# Altium footprint library LCD.PcbLib: 21 footprints (part 1 of 2)
Each footprint in its own frame and in the unit in brackets; x right, y up, seen from the top. Pads: shape width x height; smd on the part's side, far side on the other; paste and mask are expansions set on the pad; w line width, h text height; cw(c..) or ccw(c..) is an arc to the next point about the centre after c.
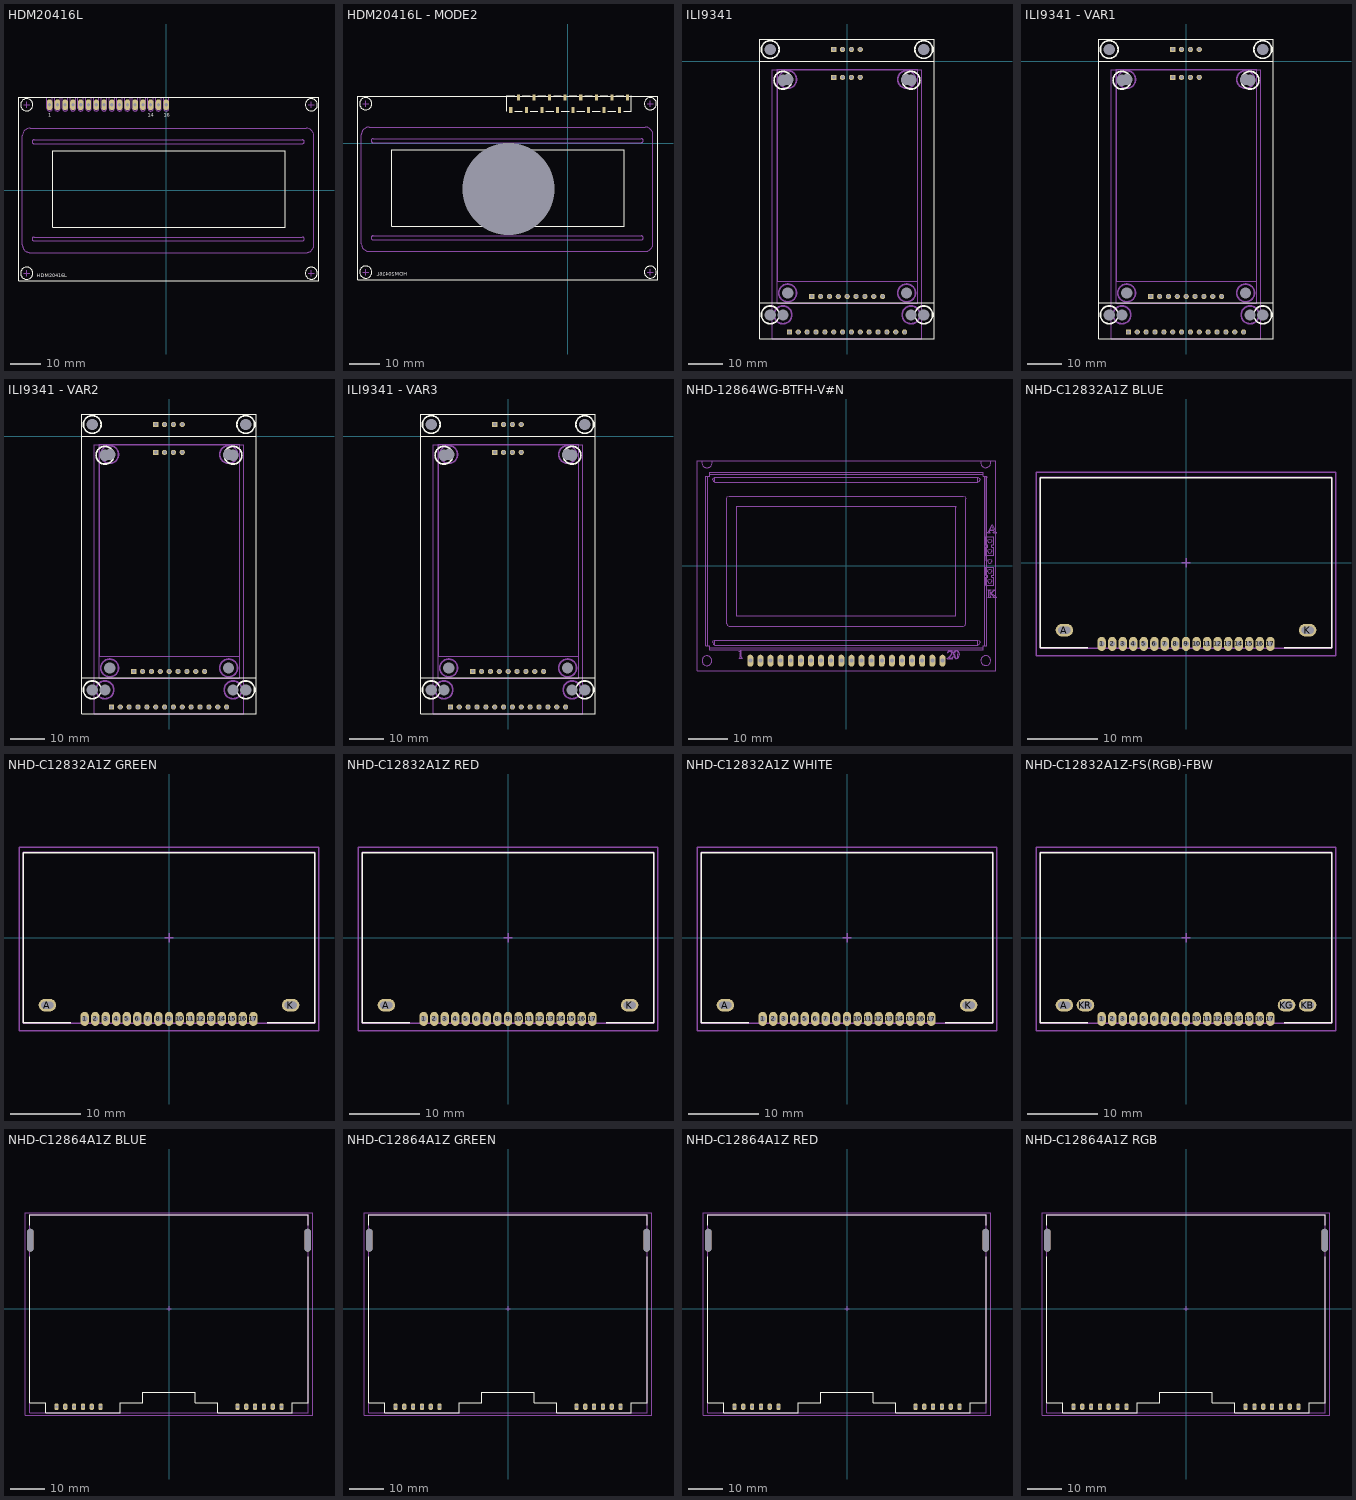
[diagram p0: the footprints below, top view; thin cyan lines are the x and y axes]

## HDM20416L [mil] "LCD 4X20 16 pins Dimensions 98 x 60 mm"
pads (16):
  oval 70x140 hole 40: 1(-1500.19,1100.28) 2(-1400.19,1100.28) 3(-1300.19,1100.28) 4(-1200.19,1100.28) 5(-1100.19,1100.28) 6(-1000.19,1100.28) 7(-900.19,1100.28) 8(-800.19,1100.28) 9(-700.19,1100.28) 10(-600.19,1100.28) 11(-500.19,1100.28) 12(-400.19,1100.28) 13(-300.19,1100.28) 14(-200.19,1100.28) 15(-100.19,1100.28) 16(-0.19,1100.28)
Top Overlay:
  circle w5: c-1795,1100 r78
  circle w5: c-1795,-1065.5 r78
  circle w5: c1866.5,-1065.5 r77.5
  circle w5: c1866,1100 r78.5
  lines w5: -1893.69,-1163.72 1964.57,-1163.72 1964.57,1198.48 -1893.69,1198.48 -1893.69,-1163.72 ; -1460.62,-474.74 -1460.62,509.51 1531.5,509.51 1531.5,-474.74 -1460.62,-474.74
  text "HDM20416L" at -1666.87,-1135.05 h77.5
  text "1" at -1520.19,930.28 h77.5
  text "14" at -240.19,930.28 h77.5
  text "16" at -35.19,930.28 h77.5
Mechanical 16:
  lines w5: -1834.64,-1065.3 -1755.9,-1065.3 ; -1834.64,1100.06 -1755.9,1100.06 ; -1795.27,-1104.67 -1795.27,-1025.93 ; -1795.27,1060.69 -1795.27,1139.43 ; -1535,1195 -1535,1055 ccw(c-1500,1055) -1465,1055 -1465,1195 ; -1519.48,1100.28 -1480.11,1100.28 ; -1499.8,1080.59 -1499.8,1119.96 ; -1435,1195 -1435,1055 ccw(c-1400,1055) -1365,1055 -1365,1195 ; -1335,1195 -1335,1055 ccw(c-1300,1055) -1265,1055 -1265,1195 ; -1235,1195 -1235,1055 ccw(c-1200,1055) -1165,1055 -1165,1195 ; -1135,1195 -1135,1055 ccw(c-1100,1055) -1065,1055 -1065,1195 ; -1035,1195 -1035,1055 ccw(c-1000,1055) -965,1055 -965,1195 ; -935,1195 -935,1055 ccw(c-900,1055) -865,1055 -865,1195 ; -835,1195 -835,1055 ccw(c-800,1055) -765,1055 -765,1195 ; -735,1195 -735,1055 ccw(c-700,1055) -665,1055 -665,1195 ; -635,1195 -635,1055 ccw(c-600,1055) -565,1055 -565,1195 ; -535,1195 -535,1055 ccw(c-500,1055) -465,1055 -465,1195 ; -435,1195 -435,1055 ccw(c-400,1055) -365,1055 -365,1195 ; -335,1195 -335,1055 ccw(c-300,1055) -265,1055 -265,1195 ; -235,1195 -235,1055 ccw(c-200,1055) -165,1055 -165,1195 ; -135,1195 -135,1055 ccw(c-100,1055) -65,1055 -65,1195 ; -35,1195 -35,1055 ccw(c0,1055) 35,1055 35,1195 ; 1826.78,-1065.3 1905.52,-1065.3 ; 1826.78,1100.06 1905.52,1100.06 ; 1866.15,-1104.67 1866.15,-1025.93 ; 1866.15,1060.69 1866.15,1139.43 ; -1850,-700 ccw(c-1750,-700) -1750,-800 1800,-800 ccw(c1800,-700) 1900,-700 1900,700 ccw(c1800,700) 1800,800 -1750,800 ccw(c-1750,700) -1850,700 -1850,-700 ; -1700,-650 cw(c-1700,-625) -1700,-600 1750,-600 cw(c1750,-625) 1750,-650 -1700,-650 ; -1700,600 cw(c-1700,625) -1700,650 1750,650 cw(c1750,625) 1750,600 -1700,600
3D body "User Library-LCD 4X20.step": height 543.81, standoff -243.59, extent -1890.68,-1162 1967.59,1200.21

## HDM20416L - MODE2 [mm] "LCD 4X20 16 pins Dimensions 98 x 60 mm"
pads (17):
  rect 1x2 smd: 1(19.431,14.932) 2(16.891,10.932) 3(14.351,14.932) 4(11.811,10.932) 5(9.271,14.932) 6(6.731,10.932) 7(4.191,14.932) 8(1.651,10.932) 9(-0.889,14.932) 10(-3.429,10.932) 11(-5.969,14.932) 12(-8.509,10.932) 13(-11.049,14.932) 14(-13.589,10.932) 15(-16.129,14.932) 16(-18.669,10.932)
  rect 0x0 hole 30 square unplated mask+0: V_WINDOW(-19.431,-14.932)
Top Overlay:
  circle w0.127: c26.937,-42.072 r1.968
  circle w0.127: c26.924,12.932 r1.994
  circle w0.127: c-66.065,-42.072 r1.981
  circle w0.127: c-66.065,12.932 r1.981
  lines w0.127: -68.572,-44.567 -68.572,15.433 29.428,15.433 29.428,-44.567 -68.572,-44.567 ; -57.572,-27.066 -57.572,-2.067 18.428,-2.067 18.428,-27.066 -57.572,-27.066
  lines w0.2: -19.939,10.392 -19.939,15.472 -17.399,15.472 ; -17.399,10.392 -14.859,10.392 ; -14.859,15.472 -12.319,15.472 ; -12.319,10.392 -9.779,10.392 ; -9.779,15.472 -7.239,15.472 ; -7.239,10.392 -4.699,10.392 ; -4.699,15.472 -2.159,15.472 ; -2.159,10.392 0.381,10.392 ; 0.381,15.472 2.921,15.472 ; 2.921,10.392 5.461,10.392 ; 5.461,15.472 8.001,15.472 ; 8.001,10.392 10.541,10.392 ; 10.541,15.472 13.081,15.472 ; 13.081,10.392 15.621,10.392 ; 15.621,15.472 18.161,15.472 ; 18.161,10.392 20.701,10.392 20.701,15.472
  text "HDM20416L" at -52.527,-43.812 h1.97
Mechanical 16:
  lines w0.127: -67.072,-42.067 -65.072,-42.067 ; -67.072,12.933 -65.072,12.933 ; -66.072,-43.067 -66.072,-41.067 ; -66.072,11.933 -66.072,13.933 ; 25.928,-42.067 27.928,-42.067 ; 25.928,12.933 27.928,12.933 ; 26.928,-43.067 26.928,-41.067 ; 26.928,11.933 26.928,13.933 ; -67.462,-32.788 ccw(c-64.922,-32.788) -64.922,-35.328 25.248,-35.328 ccw(c25.248,-32.788) 27.788,-32.788 27.788,2.772 ccw(c25.248,2.772) 25.248,5.312 -64.922,5.312 ccw(c-64.922,2.772) -67.462,2.772 -67.462,-32.788 ; -63.652,-31.518 cw(c-63.652,-30.883) -63.652,-30.248 23.978,-30.248 cw(c23.978,-30.883) 23.978,-31.518 -63.652,-31.518 ; -63.652,0.232 cw(c-63.652,0.867) -63.652,1.502 23.978,1.502 cw(c23.978,0.867) 23.978,0.232 -63.652,0.232
3D body "User Library-LCD 4X20.step": height 20.2, standoff 0.2, extent -68.561,-44.554 29.438,15.446
3D body "SSM-116-L-SV-BE.stp": height 7.37, standoff -0.13, extent -19.939,10.646 20.701,15.218

## ILI9341 [mm] "ILI9341 Compatible LCD"
pads (43):
  rect 1.5x1.5 hole 1: 1(-16.51,-77.6) 1(-10.11,-67.4) 15(-3.824,-4.6) 15(-3.824,3.4)
  round 1.5 hole 1: 2(-13.97,-77.6) 2(-7.57,-67.4) 3(-11.43,-77.6) 3(-5.03,-67.4) 4(-8.89,-77.6) 4(-2.49,-67.4) 5(-6.35,-77.6) 5(0.05,-67.4) 6(-3.81,-77.6) 6(2.59,-67.4) 7(-1.27,-77.6) 7(5.13,-67.4) 8(1.27,-77.6) 8(7.67,-67.4) 9(3.81,-77.6) 9(10.21,-67.4) 10(6.35,-77.6) 11(8.89,-77.6) 12(11.43,-77.6) 13(13.97,-77.6) 14(16.51,-77.6) 16(-1.284,-4.6) 16(-1.284,3.4) 17(1.256,-4.6) 17(1.256,3.4) 18(3.796,-4.6) 18(3.796,3.4)
  round 1.5 hole 3.2 unplated: SJ(-22,-72.68) SJ(-22,3.4) SJ(-18.36,-72.68) SJ(-18.36,-5.42) SJ(-17,-66.4) SJ(-17,-5.2) SJ(17.1,-66.4) SJ(17.1,-5.2) SJ(18.36,-72.68) SJ(18.36,-5.42) SJ(22,-72.68) SJ(22,3.4)
Top Overlay:
  circle w0.5: c22,-72.68 r2.544
  circle w0.5: c-22,-72.68 r2.544
  circle w0.5: c-22,3.4 r2.544
  circle w0.5: c22,3.4 r2.544
  circle w0.5: c-18.36,-5.42 r2.544
  circle w0.5: c18.36,-5.42 r2.544
  lines w0.254: -25,-72.68 -25,-79.6 ; -22,6.4 -25,6.4 ; 16.51,-79.6 25,-79.6 ; 22,6.4 25,6.4 ; 25,-69.2 -25,-69.2 -25,0 ; 25,0 -25,0 ; -25,-79.6 25,-79.6 ; -25,-79.6 -25,6.4 ; -25,0 -25,6.4 ; -25,6.4 25,6.4 ; 25,-79.6 25,6.4
Mechanical 1:
  circle w0.5: c-18.36,-72.68 r2.544
  circle w0.5: c18.36,-72.68 r2.544
  lines w0.254: -21.36,-79.6 -21.36,-2.42 21.36,-2.42 21.36,-79.6 -21.36,-79.6
Mechanical 15:
  circle w0.5: c17.1,-66.4 r2.544
  circle w0.5: c-17,-66.4 r2.544
  circle w0.5: c17.1,-5.2 r2.544
  circle w0.5: c-17,-5.2 r2.544
  lines w0.254: -19.9,-69.4 20.1,-69.4 20.1,-2.2 -20,-2.2 ; 20.1,-63 -20,-63 ; -20,-63 -20,-69.4 -20,-2.2 ; -20,-63 -20,-2.2
  text "Hiletgo" at -3.81,-65 h1

## ILI9341 - VAR1 [mm] "ILI9341 Compatible LCD"
pads (43):
  rect 1.5x1.5 hole 1: 1(-16.51,-77.6) 1(-10.11,-67.4) 15(-3.824,-4.6) 15(-3.824,3.4)
  round 1.5 hole 1: 2(-13.97,-77.6) 2(-7.57,-67.4) 3(-11.43,-77.6) 3(-5.03,-67.4) 4(-8.89,-77.6) 4(-2.49,-67.4) 5(-6.35,-77.6) 5(0.05,-67.4) 6(-3.81,-77.6) 6(2.59,-67.4) 7(-1.27,-77.6) 7(5.13,-67.4) 8(1.27,-77.6) 8(7.67,-67.4) 9(3.81,-77.6) 9(10.21,-67.4) 10(6.35,-77.6) 11(8.89,-77.6) 12(11.43,-77.6) 13(13.97,-77.6) 14(16.51,-77.6) 16(-1.284,-4.6) 16(-1.284,3.4) 17(1.256,-4.6) 17(1.256,3.4) 18(3.796,-4.6) 18(3.796,3.4)
  round 1.5 hole 3.2 unplated: SJ(-22,-72.68) SJ(-22,3.4) SJ(-18.36,-72.68) SJ(-18.36,-5.42) SJ(-17,-66.4) SJ(-17,-5.2) SJ(17.1,-66.4) SJ(17.1,-5.2) SJ(18.36,-72.68) SJ(18.36,-5.42) SJ(22,-72.68) SJ(22,3.4)
Top Overlay:
  circle w0.5: c18.36,-5.42 r2.544
  circle w0.5: c-18.36,-5.42 r2.544
  circle w0.5: c22,3.4 r2.544
  circle w0.5: c-22,3.4 r2.544
  circle w0.5: c-22,-72.68 r2.544
  circle w0.5: c22,-72.68 r2.544
  lines w0.254: -25,-72.68 -25,-79.6 ; -22,6.4 -25,6.4 ; 16.51,-79.6 25,-79.6 ; 22,6.4 25,6.4 ; 25,-69.2 -25,-69.2 -25,0 ; 25,0 -25,0 ; -25,-79.6 -25,6.4 ; -25,-79.6 25,-79.6 ; -25,0 -25,6.4 ; -25,6.4 25,6.4 ; 25,-79.6 25,6.4
Mechanical 1:
  circle w0.5: c18.36,-72.68 r2.544
  circle w0.5: c-18.36,-72.68 r2.544
  lines w0.254: -21.36,-79.6 21.36,-79.6 21.36,-2.42 -21.36,-2.42 -21.36,-79.6
Mechanical 15:
  circle w0.5: c-17,-5.2 r2.544
  circle w0.5: c17.1,-5.2 r2.544
  circle w0.5: c-17,-66.4 r2.544
  circle w0.5: c17.1,-66.4 r2.544
  lines w0.254: -19.9,-69.4 20.1,-69.4 20.1,-2.2 -20,-2.2 ; 20.1,-63 -20,-63 ; -20,-63 -20,-2.2 ; -20,-63 -20,-69.4 -20,-2.2
  text "Hiletgo" at -3.81,-65 h1
3D body "female_header_a-bl254-eg-g14d.stp": height 8.5, standoff -3.2, extent -17.855,-78.85 17.955,-76.35
3D body: height 12.6, standoff 11, extent -25,-80 25,6.4
3D body "pin_header_aw140-eg-g14d.stp": height 14, standoff 2.8, extent -17.73,-78.849 17.83,-76.351
3D body: height 14.1, standoff 12.6, extent -24.95,-69 25.05,0.1
3D body: height 14.2, standoff 14.1, extent -22.41,-66 22,-2.42

## ILI9341 - VAR2 [mm] "ILI9341 Compatible LCD"
pads (43):
  rect 1.5x1.5 hole 1: 1(-16.51,-77.6) 1(-10.11,-67.4) 15(-3.824,-4.6) 15(-3.824,3.4)
  round 1.5 hole 1: 2(-13.97,-77.6) 2(-7.57,-67.4) 3(-11.43,-77.6) 3(-5.03,-67.4) 4(-8.89,-77.6) 4(-2.49,-67.4) 5(-6.35,-77.6) 5(0.05,-67.4) 6(-3.81,-77.6) 6(2.59,-67.4) 7(-1.27,-77.6) 7(5.13,-67.4) 8(1.27,-77.6) 8(7.67,-67.4) 9(3.81,-77.6) 9(10.21,-67.4) 10(6.35,-77.6) 11(8.89,-77.6) 12(11.43,-77.6) 13(13.97,-77.6) 14(16.51,-77.6) 16(-1.284,-4.6) 16(-1.284,3.4) 17(1.256,-4.6) 17(1.256,3.4) 18(3.796,-4.6) 18(3.796,3.4)
  round 1.5 hole 3.2 unplated: SJ(-22,-72.68) SJ(-22,3.4) SJ(-18.36,-72.68) SJ(-18.36,-5.42) SJ(-17,-66.4) SJ(-17,-5.2) SJ(17.1,-66.4) SJ(17.1,-5.2) SJ(18.36,-72.68) SJ(18.36,-5.42) SJ(22,-72.68) SJ(22,3.4)
Top Overlay:
  circle w0.5: c18.36,-5.42 r2.544
  circle w0.5: c-18.36,-5.42 r2.544
  circle w0.5: c22,3.4 r2.544
  circle w0.5: c-22,3.4 r2.544
  circle w0.5: c-22,-72.68 r2.544
  circle w0.5: c22,-72.68 r2.544
  lines w0.254: -25,-72.68 -25,-79.6 ; -22,6.4 -25,6.4 ; 16.51,-79.6 25,-79.6 ; 22,6.4 25,6.4 ; 25,-69.2 -25,-69.2 -25,0 ; 25,0 -25,0 ; -25,-79.6 -25,6.4 ; -25,-79.6 25,-79.6 ; -25,0 -25,6.4 ; -25,6.4 25,6.4 ; 25,-79.6 25,6.4
Mechanical 1:
  circle w0.5: c18.36,-72.68 r2.544
  circle w0.5: c-18.36,-72.68 r2.544
  lines w0.254: -21.36,-79.6 21.36,-79.6 21.36,-2.42 -21.36,-2.42 -21.36,-79.6
Mechanical 15:
  circle w0.5: c-17,-5.2 r2.544
  circle w0.5: c17.1,-5.2 r2.544
  circle w0.5: c-17,-66.4 r2.544
  circle w0.5: c17.1,-66.4 r2.544
  lines w0.254: -19.9,-69.4 20.1,-69.4 20.1,-2.2 -20,-2.2 ; 20.1,-63 -20,-63 ; -20,-63 -20,-2.2 ; -20,-63 -20,-69.4 -20,-2.2
  text "Hiletgo" at -3.81,-65 h1
3D body "female_header_a-bl254-eg-g14d.stp": height 8.5, standoff -3.2, extent -17.855,-78.85 17.955,-76.35
3D body: height 12.6, standoff 11, extent -21.204,-79.6 21.36,-2.42
3D body "pin_header_aw140-eg-g14d.stp": height 14, standoff 2.8, extent -17.73,-78.849 17.83,-76.351
3D body: height 14.1, standoff 12.6, extent -21.36,-69.2 21.36,-8
3D body: height 14.2, standoff 14.1, extent -19.615,-66 19,-8.71

## ILI9341 - VAR3 [mm] "ILI9341 Compatible LCD"
pads (43):
  rect 1.5x1.5 hole 1: 1(-16.51,-77.6) 1(-10.11,-67.4) 15(-3.824,-4.6) 15(-3.824,3.4)
  round 1.5 hole 1: 2(-13.97,-77.6) 2(-7.57,-67.4) 3(-11.43,-77.6) 3(-5.03,-67.4) 4(-8.89,-77.6) 4(-2.49,-67.4) 5(-6.35,-77.6) 5(0.05,-67.4) 6(-3.81,-77.6) 6(2.59,-67.4) 7(-1.27,-77.6) 7(5.13,-67.4) 8(1.27,-77.6) 8(7.67,-67.4) 9(3.81,-77.6) 9(10.21,-67.4) 10(6.35,-77.6) 11(8.89,-77.6) 12(11.43,-77.6) 13(13.97,-77.6) 14(16.51,-77.6) 16(-1.284,-4.6) 16(-1.284,3.4) 17(1.256,-4.6) 17(1.256,3.4) 18(3.796,-4.6) 18(3.796,3.4)
  round 1.5 hole 3.2 unplated: SJ(-22,-72.68) SJ(-22,3.4) SJ(-18.36,-72.68) SJ(-18.36,-5.42) SJ(-17,-66.4) SJ(-17,-5.2) SJ(17.1,-66.4) SJ(17.1,-5.2) SJ(18.36,-72.68) SJ(18.36,-5.42) SJ(22,-72.68) SJ(22,3.4)
Top Overlay:
  circle w0.5: c22,-72.68 r2.544
  circle w0.5: c-22,-72.68 r2.544
  circle w0.5: c-22,3.4 r2.544
  circle w0.5: c22,3.4 r2.544
  circle w0.5: c-18.36,-5.42 r2.544
  circle w0.5: c18.36,-5.42 r2.544
  lines w0.254: -25,-72.68 -25,-79.6 ; -22,6.4 -25,6.4 ; 16.51,-79.6 25,-79.6 ; 22,6.4 25,6.4 ; 25,-69.2 -25,-69.2 -25,0 ; 25,0 -25,0 ; -25,-79.6 25,-79.6 ; -25,-79.6 -25,6.4 ; -25,0 -25,6.4 ; -25,6.4 25,6.4 ; 25,-79.6 25,6.4
Mechanical 1:
  circle w0.5: c-18.36,-72.68 r2.544
  circle w0.5: c18.36,-72.68 r2.544
  lines w0.254: -21.36,-79.6 -21.36,-2.42 21.36,-2.42 21.36,-79.6 -21.36,-79.6
Mechanical 15:
  circle w0.5: c17.1,-66.4 r2.544
  circle w0.5: c-17,-66.4 r2.544
  circle w0.5: c17.1,-5.2 r2.544
  circle w0.5: c-17,-5.2 r2.544
  lines w0.254: -19.9,-69.4 20.1,-69.4 20.1,-2.2 -20,-2.2 ; 20.1,-63 -20,-63 ; -20,-63 -20,-69.4 -20,-2.2 ; -20,-63 -20,-2.2
  text "Hiletgo" at -3.81,-65 h1
3D body "female_header_a-bl254-eg-g09d.stp": height 8.5, standoff -3.2, extent -11.505,-68.65 11.605,-66.15
3D body: height 12.6, standoff 11, extent -20,-69.4 20.012,-2.42
3D body: height 14.1, standoff 12.6, extent -20,-63 20.1,-9
3D body: height 14.2, standoff 14.1, extent -18.36,-61.5 18.36,-10.5
3D body "pin_header_aw140-eg-g09d.stp": height 14, standoff 2.8, extent -11.38,-68.649 11.48,-66.151

## NHD-12864WG-BTFH-V#N [mm]
pads (20):
  oval 1.5x3 hole 1: 1(-24.13,-23.85) 2(-21.59,-23.85) 3(-19.05,-23.85) 4(-16.51,-23.85) 5(-13.97,-23.85) 6(-11.43,-23.85) 7(-8.89,-23.85) 8(-6.35,-23.85) 9(-3.81,-23.85) 10(-1.27,-23.85) 11(1.27,-23.85) 12(3.81,-23.85) 13(6.35,-23.85) 14(8.89,-23.85) 15(11.43,-23.85) 16(13.97,-23.85) 17(16.51,-23.85) 18(19.05,-23.85) 19(21.59,-23.85) 20(24.13,-23.85)
Mechanical 14:
  drawing of 360 lines, arcs and shapes, not listed
Mechanical 16:
  circle w0.127: c35.014,-23.825 r1.231
  circle w0.127: c-35.027,-23.863 r1.231
  lines w0.127: -37.033,26.34 -33.023,26.34 ; -36.291,26.34 -37.517,26.34 ; -36.259,26.276 ccw(c-35.006,25.894) -33.757,26.289 ; -33.766,26.34 33.793,26.34 ; 33.013,26.34 37.024,26.34 ; 33.757,26.327 ccw(c35.01,25.945) 36.258,26.34 ; 36.245,26.34 37.507,26.34 ; -37.517,-26.361 -37.517,-26.394 -37.48,-26.394 -37.48,-26.361 -37.517,-26.361 ; -37.517,-26.361 37.507,-26.361 37.507,26.307 ; -37.517,-26.361 -37.517,26.34 ; -37.517,26.34 -37.517,26.307 -37.48,26.307 -37.48,26.34 -37.517,26.34 ; 37.507,26.307 37.544,26.307 37.544,26.34 37.507,26.34 ; 37.507,26.307 37.507,26.34 ; 37.507,26.34 37.507,26.34 ; 27.294,-26.394 27.294,-26.361 27.331,-26.361 27.331,-26.394 27.294,-26.394
3D body: height 15, standoff 12.1, extent 33.02,-17.145 37.338,19.685
3D body: height 17, standoff 12.1, extent -25.527,-21.209 35.306,23.495
3D body: height 17, standoff 12.1, extent -35.433,-21.209 -25.4,23.495
3D body: height 12.1, standoff 11.1, extent -37.465,-26.289 37.465,26.289
3D body: height 16.02, standoff 12.1, extent -29.845,-15.113 30.099,17.399
3D body: height 11, standoff 0, extent -36.552,-25.376 -33.552,-22.376
3D body: height 11, standoff 0, extent 33.527,-25.35 36.527,-22.35
3D body: height 11, standoff 0, extent 33.501,24.459 36.501,27.459
3D body: height 11, standoff 0, extent -36.476,24.434 -33.476,27.434
3D body "pin_header_aw140-eg-g20d.stp": height 14.08, standoff 2.88, extent -25.273,-25.146 25.527,-22.648
3D body "female_header_a-bl254-eg-g10d.stp": height 8.5, standoff -3.2, extent -25.525,-25.126 0.125,-22.626
3D body "female_header_a-bl254-eg-g10d.stp": height 8.5, standoff -3.2, extent 0.002,-25.126 25.652,-22.626

## NHD-C12832A1Z BLUE [mm]
height 6.4
pads (19):
  oval 1.2x2 hole 0.8: 1(-12,-11.55) 2(-10.5,-11.55) 3(-9,-11.55) 4(-7.5,-11.55) 5(-6,-11.55) 6(-4.5,-11.55) 7(-3,-11.55) 8(-1.5,-11.55) 9(0,-11.55) 10(1.5,-11.55) 11(3,-11.55) 12(4.5,-11.55) 13(6,-11.55) 14(7.5,-11.55) 15(9,-11.55) 16(10.5,-11.55) 17(12,-11.55)
  oval 2.5x1.75 hole 1 slot 1.75 at 0 deg: A(-17.3,-9.6) K(17.3,-9.6)
Top Overlay:
  lines w0.2: -14,-12.1 -20.7,-12.1 -20.7,12.1 0,12.1 20.7,12.1 20.7,-12.1 14,-12.1
Mechanical 13:
  lines w0.2: -20.7,-12.15 -20.7,12.15 20.7,12.15 20.7,-12.15 -20.7,-12.15
Mechanical 15:
  lines w0.2: -0.635,0 0.635,0 ; 0,-0.635 0,0.635 ; -21.336,-13.208 21.336,-13.208 21.336,12.827 -21.336,12.827 -21.336,-13.208
3D body "NHD-C12832A1Z-FSB.STEP": height 4.9, standoff -2.1, extent -20.7,-12.15 20.7,12.15

## NHD-C12832A1Z GREEN [mm]
height 6.4
pads (19):
  oval 1.2x2 hole 0.8: 1(-12,-11.55) 2(-10.5,-11.55) 3(-9,-11.55) 4(-7.5,-11.55) 5(-6,-11.55) 6(-4.5,-11.55) 7(-3,-11.55) 8(-1.5,-11.55) 9(0,-11.55) 10(1.5,-11.55) 11(3,-11.55) 12(4.5,-11.55) 13(6,-11.55) 14(7.5,-11.55) 15(9,-11.55) 16(10.5,-11.55) 17(12,-11.55)
  oval 2.5x1.75 hole 1 slot 1.75 at 0 deg: A(-17.3,-9.6) K(17.3,-9.6)
Top Overlay:
  lines w0.2: -14,-12.1 -20.7,-12.1 -20.7,12.1 0,12.1 20.7,12.1 20.7,-12.1 14,-12.1
Mechanical 13:
  lines w0.2: -20.7,-12.15 20.7,-12.15 20.7,12.15 -20.7,12.15 -20.7,-12.15
Mechanical 15:
  lines w0.2: -0.635,0 0.635,0 ; 0,-0.635 0,0.635 ; -21.336,-13.208 -21.336,12.827 21.336,12.827 21.336,-13.208 -21.336,-13.208
3D body "NHD-C12832A1Z-FSG.STEP": height 4.9, standoff -2.1, extent -20.7,-12.15 20.7,12.15

## NHD-C12832A1Z RED [mm]
height 6.4
pads (19):
  oval 1.2x2 hole 0.8: 1(-12,-11.55) 2(-10.5,-11.55) 3(-9,-11.55) 4(-7.5,-11.55) 5(-6,-11.55) 6(-4.5,-11.55) 7(-3,-11.55) 8(-1.5,-11.55) 9(0,-11.55) 10(1.5,-11.55) 11(3,-11.55) 12(4.5,-11.55) 13(6,-11.55) 14(7.5,-11.55) 15(9,-11.55) 16(10.5,-11.55) 17(12,-11.55)
  oval 2.5x1.75 hole 1 slot 1.75 at 0 deg: A(-17.3,-9.6) K(17.3,-9.6)
Top Overlay:
  lines w0.2: -14,-12.1 -20.7,-12.1 -20.7,12.1 0,12.1 20.7,12.1 20.7,-12.1 14,-12.1
Mechanical 13:
  lines w0.2: -20.7,-12.15 -20.7,12.15 20.7,12.15 20.7,-12.15 -20.7,-12.15
Mechanical 15:
  lines w0.2: -0.635,0 0.635,0 ; 0,-0.635 0,0.635 ; -21.336,-13.208 21.336,-13.208 21.336,12.827 -21.336,12.827 -21.336,-13.208
3D body "NHD-C12832A1Z-FSR.STEP": height 4.9, standoff -2.1, extent -20.7,-12.15 20.7,12.15

## NHD-C12832A1Z WHITE [mm]
height 6.4
pads (19):
  oval 1.2x2 hole 0.8: 1(-12,-11.55) 2(-10.5,-11.55) 3(-9,-11.55) 4(-7.5,-11.55) 5(-6,-11.55) 6(-4.5,-11.55) 7(-3,-11.55) 8(-1.5,-11.55) 9(0,-11.55) 10(1.5,-11.55) 11(3,-11.55) 12(4.5,-11.55) 13(6,-11.55) 14(7.5,-11.55) 15(9,-11.55) 16(10.5,-11.55) 17(12,-11.55)
  oval 2.5x1.75 hole 1 slot 1.75 at 0 deg: A(-17.3,-9.6) K(17.3,-9.6)
Top Overlay:
  lines w0.2: -14,-12.1 -20.7,-12.1 -20.7,12.1 0,12.1 20.7,12.1 20.7,-12.1 14,-12.1
Mechanical 13:
  lines w0.2: -20.7,-12.15 20.7,-12.15 20.7,12.15 -20.7,12.15 -20.7,-12.15
Mechanical 15:
  lines w0.2: -0.635,0 0.635,0 ; 0,-0.635 0,0.635 ; -21.336,-13.208 -21.336,12.827 21.336,12.827 21.336,-13.208 -21.336,-13.208
3D body "NHD-C12832A1Z-FSW.STEP": height 4.9, standoff -2.1, extent -20.7,-12.15 20.7,12.15

## NHD-C12832A1Z-FS(RGB)-FBW [mm]
height 6.4
pads (21):
  oval 1.2x2 hole 0.8: 1(-12,-11.55) 2(-10.5,-11.55) 3(-9,-11.55) 4(-7.5,-11.55) 5(-6,-11.55) 6(-4.5,-11.55) 7(-3,-11.55) 8(-1.5,-11.55) 9(0,-11.55) 10(1.5,-11.55) 11(3,-11.55) 12(4.5,-11.55) 13(6,-11.55) 14(7.5,-11.55) 15(9,-11.55) 16(10.5,-11.55) 17(12,-11.55)
  oval 2.5x1.75 hole 1 slot 1.75 at 0 deg: A(-17.3,-9.6) KB(17.3,-9.6) KG(14.3,-9.6) KR(-14.3,-9.6)
Top Overlay:
  lines w0.2: -14,-12.1 -20.7,-12.1 -20.7,12.1 0,12.1 20.7,12.1 20.7,-12.1 14,-12.1
Mechanical 13:
  lines w0.2: -20.7,-12.15 20.7,-12.15 20.7,12.15 -20.7,12.15 -20.7,-12.15
Mechanical 15:
  lines w0.2: -0.635,0 0.635,0 ; 0,-0.635 0,0.635 ; -21.336,-13.208 -21.336,12.827 21.336,12.827 21.336,-13.208 -21.336,-13.208
3D body "NHD-C12832A1Z-FSRGB.STEP": height 4.9, standoff -2.1, extent -20.7,-12.15 20.7,12.15

## NHD-C12864A1Z BLUE [mm]
height 7
pads (14):
  oval 1.2x2 hole 0.8: 1(-32.38,-28.2) 2(-29.84,-28.2) 3(-27.3,-28.2) 4(-24.76,-28.2) 5(-22.22,-28.2) 6(-19.68,-28.2) 7(19.68,-28.2) 8(22.22,-28.2) 9(24.76,-28.2) 10(27.3,-28.2) 11(29.84,-28.2) 12(32.38,-28.2)
  oval 1.8x6.5 hole 1.8 slot 6.5 at 90 deg unplated: M(-39.9,19.7) M(39.9,19.7)
Top Overlay:
  lines w0.2: -40,15 -40,-27 -35.5,-27 -35.5,-30 -14,-30 -14,-27 -7.5,-27 -7.5,-24 0,-24 7.5,-24 7.5,-27 14,-27 14,-30 35.5,-30 35.5,-27 40,-27 40,15 ; -40,24 -40,27 0,27 40,27 40,24
Mechanical 13:
  lines w0.2: -40,-30 -40,27 40,27 40,-30 -40,-30
Mechanical 15:
  lines w0.2: -0.635,0 0.635,0 ; 0,-0.635 0,0.635 ; -41.402,-30.607 -41.402,27.559 41.402,27.559 41.402,-30.607 -41.402,-30.607
3D body "NHD-C12864A1Z BLUE.STEP": height 7, standoff -6.6, extent -40,-30 40,27

## NHD-C12864A1Z GREEN [mm]
height 7
pads (14):
  oval 1.2x2 hole 0.8: 1(-32.38,-28.2) 2(-29.84,-28.2) 3(-27.3,-28.2) 4(-24.76,-28.2) 5(-22.22,-28.2) 6(-19.68,-28.2) 7(19.68,-28.2) 8(22.22,-28.2) 9(24.76,-28.2) 10(27.3,-28.2) 11(29.84,-28.2) 12(32.38,-28.2)
  oval 1.8x6.5 hole 1.8 slot 6.5 at 90 deg unplated: M(-39.9,19.7) M(39.9,19.7)
Top Overlay:
  lines w0.2: -40,15 -40,-27 -35.5,-27 -35.5,-30 -14,-30 -14,-27 -7.5,-27 -7.5,-24 0,-24 7.5,-24 7.5,-27 14,-27 14,-30 35.5,-30 35.5,-27 40,-27 40,15 ; -40,24 -40,27 0,27 40,27 40,24
Mechanical 13:
  lines w0.2: -40,-30 -40,27 40,27 40,-30 -40,-30
Mechanical 15:
  lines w0.2: -0.635,0 0.635,0 ; 0,-0.635 0,0.635 ; -41.402,-30.607 -41.402,27.559 41.402,27.559 41.402,-30.607 -41.402,-30.607
3D body "NHD-C12864A1Z GREEN.STEP": height 7, standoff -6.6, extent -40,-30 40,27

## NHD-C12864A1Z RED [mm]
height 7
pads (14):
  oval 1.2x2 hole 0.8: 1(-32.38,-28.2) 2(-29.84,-28.2) 3(-27.3,-28.2) 4(-24.76,-28.2) 5(-22.22,-28.2) 6(-19.68,-28.2) 7(19.68,-28.2) 8(22.22,-28.2) 9(24.76,-28.2) 10(27.3,-28.2) 11(29.84,-28.2) 12(32.38,-28.2)
  oval 1.8x6.5 hole 1.8 slot 6.5 at 90 deg unplated: M(-39.9,19.7) M(39.9,19.7)
Top Overlay:
  lines w0.2: -40,15 -40,-27 -35.5,-27 -35.5,-30 -14,-30 -14,-27 -7.5,-27 -7.5,-24 0,-24 7.5,-24 7.5,-27 14,-27 14,-30 35.5,-30 35.5,-27 40,-27 40,15 ; -40,24 -40,27 0,27 40,27 40,24
Mechanical 13:
  lines w0.2: -40,-30 -40,27 40,27 40,-30 -40,-30
Mechanical 15:
  lines w0.2: -0.635,0 0.635,0 ; 0,-0.635 0,0.635 ; -41.402,-30.607 -41.402,27.559 41.402,27.559 41.402,-30.607 -41.402,-30.607
3D body "NHD-C12864A1Z RED.STEP": height 7, standoff -6.6, extent -40,-30 40,27

## NHD-C12864A1Z RGB [mm]
height 7
pads (16):
  oval 1.2x2 hole 0.8: 1(-32.38,-28.2) 2(-29.84,-28.2) 3(-27.3,-28.2) 4(-24.76,-28.2) 5(-22.22,-28.2) 6(-19.68,-28.2) 7(-17.14,-28.2) 8(17.14,-28.2) 9(19.68,-28.2) 10(22.22,-28.2) 11(24.76,-28.2) 12(27.3,-28.2) 13(29.84,-28.2) 14(32.38,-28.2)
  oval 1.8x6.5 hole 1.8 slot 6.5 at 90 deg unplated: M(-39.9,19.7) M(39.9,19.7)
Top Overlay:
  lines w0.2: -40,15 -40,-27 -35.5,-27 -35.5,-30 -14,-30 -14,-27 -7.5,-27 -7.5,-24 0,-24 7.5,-24 7.5,-27 14,-27 14,-30 35.5,-30 35.5,-27 40,-27 40,15 ; -40,24 -40,27 0,27 40,27 40,24
Mechanical 13:
  lines w0.2: -40,-30 40,-30 40,27 -40,27 -40,-30
Mechanical 15:
  lines w0.2: -0.635,0 0.635,0 ; 0,-0.635 0,0.635 ; -41.402,-30.607 41.402,-30.607 41.402,27.559 -41.402,27.559 -41.402,-30.607
3D body "NHD-C12864A1Z RGB.STEP": height 7, standoff -6.6, extent -40,-30 40,27